# Altium footprint library DM1097_PcbLib.PcbLib: 7 footprints
Each footprint in its own frame and in the unit in brackets; x right, y up, seen from the top. Pads: shape width x height; smd on the part's side, far side on the other; paste and mask are expansions set on the pad; w line width, h text height; cw(c..) or ccw(c..) is an arc to the next point about the centre after c.
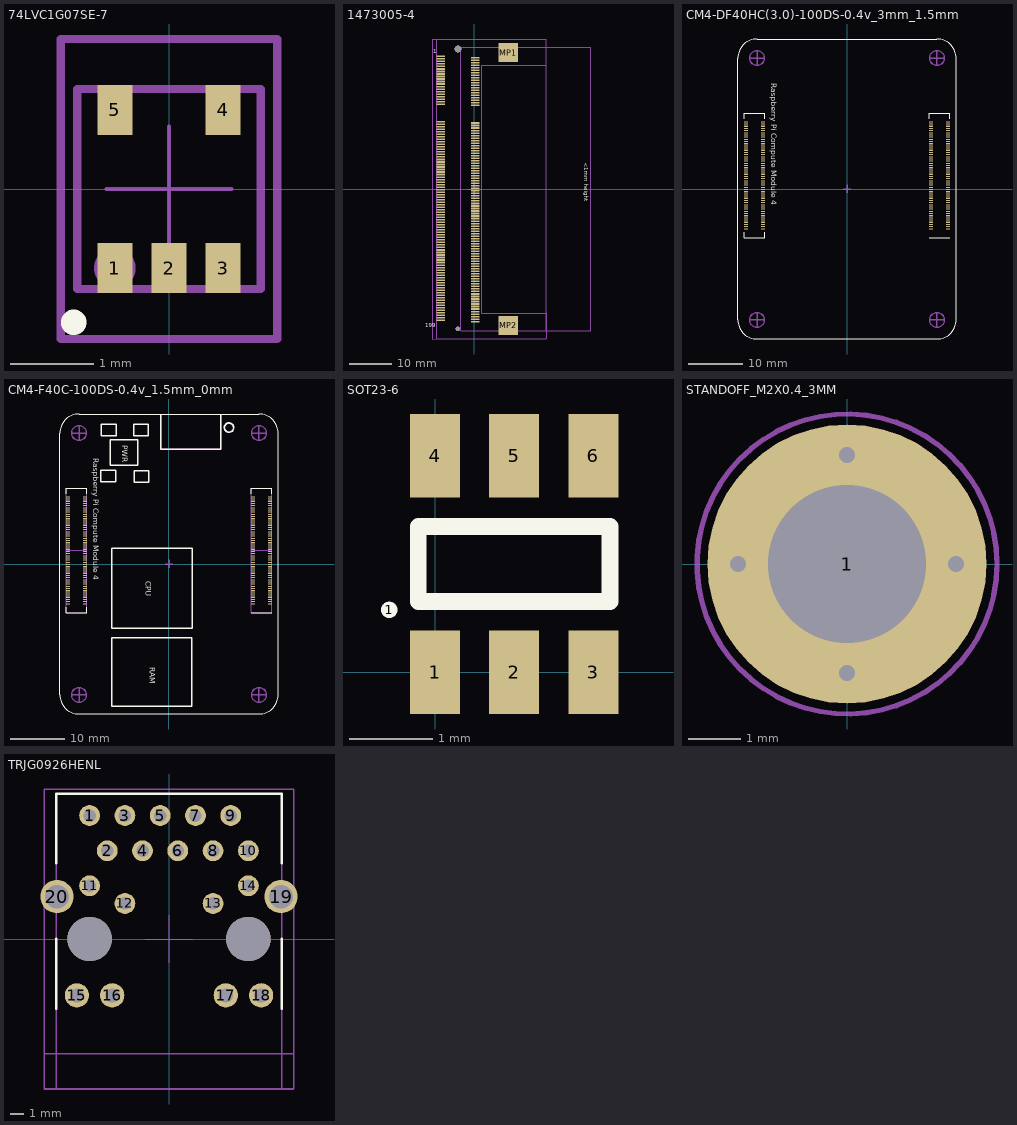
[diagram p0: the footprints below, top view; thin cyan lines are the x and y axes]

## 74LVC1G07SE-7 [mm] "SC70-5 1.1mm"
height 1.1
pads (5):
  rect 0.42x0.6 smd paste-0.025 mask+0.05: 1(-0.65,-0.95) 2(0,-0.95) 3(0.65,-0.95) 4(0.65,0.95) 5(-0.65,0.95)
Top Overlay:
  circle w0.254: c-1.143,-1.6 r0.025
Top Assembly:
  circle w0.1: c-0.65,-0.95 r0.2
  lines w0.1: -1.3,-1.8 -1.3,1.8 1.3,1.8 1.3,-1.8 -1.3,-1.8
  text "'.Designator'" at 0,0 h1
Top Courtyard:
  lines w0.05: -0.75,0 0,0 ; 0,-0.75 0,0 ; 0,0.75 0,0 ; 0.75,0 0,0 ; -1.3,-1.8 1.3,-1.8 1.3,1.8 -1.3,1.8 -1.3,-1.8
Top Component Outline:
  lines w0.1: -1.1,-1.2 1.1,-1.2 1.1,1.2 -1.1,1.2 -1.1,-1.2
3D body "User Library-SOT353-1.step": height 1.1, standoff 0, extent -1.1,-1.2 1.1,1.2

## 1473005-4 [mm] "DDR2 SODIMM SOCKET 200P 5"
height 5.2
pads (204):
  rect 2.05x0.38 smd: 1(-8.05,31.65) 1(-8.05,31.65) 2(0.15,31.35) 2(0.15,31.35) 3(-8.05,31.05) 4(0.15,30.75) 5(-8.05,30.45) 6(0.15,30.15) 7(-8.05,29.85) 8(0.15,29.55) 9(-8.05,29.25) 10(0.15,28.95) 11(-8.05,28.65) 12(0.15,28.35) 13(-8.05,28.05) 14(0.15,27.75) 15(-8.05,27.45) 16(0.15,27.15) 17(-8.05,26.85) 18(0.15,26.55) 19(-8.05,26.25) 20(0.15,25.95) 21(-8.05,25.65) 22(0.15,25.35) 23(-8.05,25.05) 24(0.15,24.75) 25(-8.05,24.45) 26(0.15,24.15) 27(-8.05,23.85) 28(0.15,23.55) 29(-8.05,23.25) 30(0.15,22.95) 31(-8.05,22.65) 32(0.15,22.35) 33(-8.05,22.05) 34(0.15,21.75) 35(-8.05,21.45) 36(0.15,21.15) 37(-8.05,20.85) 38(0.15,20.55) 39(-8.05,20.25) 40(0.15,19.95) 41(-8.05,16.05) 42(0.15,15.75) 43(-8.05,15.45) 44(0.15,15.15) 45(-8.05,14.85) 46(0.15,14.55) 47(-8.05,14.25) 48(0.15,13.95) 49(-8.05,13.65) 50(0.15,13.35) 51(-8.05,13.05) 52(0.15,12.75) 53(-8.05,12.45) 54(0.15,12.15) 55(-8.05,11.85) 56(0.15,11.55) 57(-8.05,11.25) 58(0.15,10.95) 59(-8.05,10.65) 60(0.15,10.35) 61(-8.05,10.05) 62(0.15,9.75) 63(-8.05,9.45) 64(0.15,9.15) 65(-8.05,8.85) 66(0.15,8.55) 67(-8.05,8.25) 68(0.15,7.95) 69(-8.05,7.65) 70(0.15,7.35) 71(-8.05,7.05) 72(0.15,6.75) 73(-8.05,6.45) 74(0.15,6.15) 75(-8.05,5.85) 76(0.15,5.55) 77(-8.05,5.25) 78(0.15,4.95) 79(-8.05,4.65) 80(0.15,4.35) 81(-8.05,4.05) 82(0.15,3.75) 83(-8.05,3.45) 84(0.15,3.15) 85(-8.05,2.85) 86(0.15,2.55) 87(-8.05,2.25) 88(0.15,1.95) 89(-8.05,1.65) 90(0.15,1.35) 91(-8.05,1.05) 92(0.15,0.75) 93(-8.05,0.45) 94(0.15,0.15) 95(-8.05,-0.15) 96(0.15,-0.45) 97(-8.05,-0.75) 98(0.15,-1.05) 99(-8.05,-1.35) 100(0.15,-1.65) 101(-8.05,-1.95) 102(0.15,-2.25) 103(-8.05,-2.55) 104(0.15,-2.85) 105(-8.05,-3.15) 106(0.15,-3.45) 107(-8.05,-3.75) 108(0.15,-4.05) 109(-8.05,-4.35) 110(0.15,-4.65) 111(-8.05,-4.95) 112(0.15,-5.25) 113(-8.05,-5.55) 114(0.15,-5.85) 115(-8.05,-6.15) 116(0.15,-6.45) 117(-8.05,-6.75) 118(0.15,-7.05) 119(-8.05,-7.35) 120(0.15,-7.65) 121(-8.05,-7.95) 122(0.15,-8.25) 123(-8.05,-8.55) 124(0.15,-8.85) 125(-8.05,-9.15) 126(0.15,-9.45) 127(-8.05,-9.75) 128(0.15,-10.05) 129(-8.05,-10.35) 130(0.15,-10.65) 131(-8.05,-10.95) 132(0.15,-11.25) 133(-8.05,-11.55) 134(0.15,-11.85) 135(-8.05,-12.15) 136(0.15,-12.45) 137(-8.05,-12.75) 138(0.15,-13.05) 139(-8.05,-13.35) 140(0.15,-13.65) 141(-8.05,-13.95) 142(0.15,-14.25) 143(-8.05,-14.55) 144(0.15,-14.85) 145(-8.05,-15.15) 146(0.15,-15.45) 147(-8.05,-15.75) 148(0.15,-16.05) 149(-8.05,-16.35) 150(0.15,-16.65) 151(-8.05,-16.95) 152(0.15,-17.25) 153(-8.05,-17.55) 154(0.15,-17.85) 155(-8.05,-18.15) 156(0.15,-18.45) 157(-8.05,-18.75) 158(0.15,-19.05) 159(-8.05,-19.35) 160(0.15,-19.65) 161(-8.05,-19.95) 162(0.15,-20.25) 163(-8.05,-20.55) 164(0.15,-20.85) 165(-8.05,-21.15) 166(0.15,-21.45) 167(-8.05,-21.75) 168(0.15,-22.05) 169(-8.05,-22.35) 170(0.15,-22.65) 171(-8.05,-22.95) 172(0.15,-23.25) 173(-8.05,-23.55) 174(0.15,-23.85) 175(-8.05,-24.15) 176(0.15,-24.45) 177(-8.05,-24.75) 178(0.15,-25.05) 179(-8.05,-25.35) 180(0.15,-25.65) 181(-8.05,-25.95) 182(0.15,-26.25) 183(-8.05,-26.55) 184(0.15,-26.85) 185(-8.05,-27.15) 186(0.15,-27.45) 187(-8.05,-27.75) 188(0.15,-28.05) 189(-8.05,-28.35) 190(0.15,-28.65) 191(-8.05,-28.95) 192(0.15,-29.25) 193(-8.05,-29.55) 194(0.15,-29.85) 195(-8.05,-30.15) 196(0.15,-30.45) 197(-8.05,-30.75) 198(0.15,-31.05) 199(-8.05,-31.35) 200(0.15,-31.65)
  rect 4.6x4.5 smd: MP1(8.05,32.55) MP2(8.05,-32.55)
via -3.95,-33.4 diameter 1.1 hole 1.1
via -3.95,33.4 diameter 1.6 hole 1.6
Top Overlay:
  text "199" at -11.75,-33 h1
  text "1" at -9.85,32.4 h1
  text "<1mm height" at 26.15,6.3 h1
Top Assembly:
  lines w0.1: -9.95,35.8 -9.95,-35.8 17.1,-35.75 17.1,-33.8 ; -9.95,35.801 17.1,35.75 ; -8.95,35.75 17.1,35.75 ; 1.75,29.55 1.75,-29.6 17.1,-29.6 ; 1.75,29.55 1.75,29.55 ; 1.75,29.55 17.1,29.55 17.1,33.8 17.1,33.8 ; 17.1,-29.6 17.1,-29.6 17.1,-33.8 ; 17.1,-29.6 17.1,-29.6 ; 17.1,-33.8 27.75,-33.8 27.75,33.8 17.1,33.8 ; 17.1,33.8 17.1,35.75
  text "'.Designator'" at -0.032,-0.04 h1.52
Board:
  region: -1.75,33.4
Top Courtyard:
  lines w0.1: 0,-1.5 0,0 ; 0,1.6 0,0 ; 1.5,0 0,0 ; 17.1,-33.8 27.75,-33.8 27.75,33.8 17.1,33.8 ; 0,0 -1.6,0 0,0 ; -9.95,-35.801 17.1,-35.75 17.1,-29.6 1.75,-29.6 1.75,29.55 17.1,29.55 17.1,35.75 -9.95,35.801 -9.95,-35.801
  text "<1mm height" at 15.2,4.9 h1
Top Component Outline:
  lines w0.1: 17.1,-33.8 27.75,-33.8 27.75,33.8 17.1,33.8 ; 17.1,-33.8 17.1,33.8 ; 17.1,-33.8 -3.25,-33.8 -3.25,33.8 17.1,33.8 ; 17.1,-33.8 17.1,-35.75 -8.95,-35.75 -8.95,35.75 17.1,35.75 17.1,33.8
3D body "c-1473005-4-j1-3d.stp": height 5.2, standoff -0.7, extent -8.95,-35.75 17.1,35.75
3D body "Compute Module.stp": height 4.8, standoff 2.2, extent -3.25,-33.8 27.75,33.8

## CM4-DF40HC(3.0)-100DS-0.4v_3mm_1.5mm [mm] "DF40HC(3.0)-100DS-0.4v by Amornthep Phunsin"
pads (200):
  rect 0.7x0.2 smd: 1(18.5,-7.3) 2(15.42,-7.3) 3(18.5,-6.9) 4(15.42,-6.9) 5(18.5,-6.5) 6(15.42,-6.5) 7(18.5,-6.1) 8(15.42,-6.1) 9(18.5,-5.7) 10(15.42,-5.7) 11(18.5,-5.3) 12(15.42,-5.3) 13(18.5,-4.9) 14(15.42,-4.9) 15(18.5,-4.5) 16(15.42,-4.5) 17(18.5,-4.1) 18(15.42,-4.1) 19(18.5,-3.7) 20(15.42,-3.7) 21(18.5,-3.3) 22(15.42,-3.3) 23(18.5,-2.9) 24(15.42,-2.9) 25(18.5,-2.5) 26(15.42,-2.5) 27(18.5,-2.1) 28(15.42,-2.1) 29(18.5,-1.7) 30(15.42,-1.7) 31(18.5,-1.3) 32(15.42,-1.3) 33(18.5,-0.9) 34(15.42,-0.9) 35(18.5,-0.5) 36(15.42,-0.5) 37(18.5,-0.1) 38(15.42,-0.1) 39(18.5,0.3) 40(15.42,0.3) 41(18.5,0.7) 42(15.42,0.7) 43(18.5,1.1) 44(15.42,1.1) 45(18.5,1.5) 46(15.42,1.5) 47(18.5,1.9) 48(15.42,1.9) 49(18.5,2.3) 50(15.42,2.3) 51(18.5,2.7) 52(15.42,2.7) 53(18.5,3.1) 54(15.42,3.1) 55(18.5,3.5) 56(15.42,3.5) 57(18.5,3.9) 58(15.42,3.9) 59(18.5,4.3) 60(15.42,4.3) 61(18.5,4.7) 62(15.42,4.7) 63(18.5,5.1) 64(15.42,5.1) 65(18.5,5.5) 66(15.42,5.5) 67(18.5,5.9) 68(15.42,5.9) 69(18.5,6.3) 70(15.42,6.3) 71(18.5,6.7) 72(15.42,6.7) 73(18.5,7.1) 74(15.42,7.1) 75(18.5,7.5) 76(15.42,7.5) 77(18.5,7.9) 78(15.42,7.9) 79(18.5,8.3) 80(15.42,8.3) 81(18.5,8.7) 82(15.42,8.7) 83(18.5,9.1) 84(15.42,9.1) 85(18.5,9.5) 86(15.42,9.5) 87(18.5,9.9) 88(15.42,9.9) 89(18.5,10.3) 90(15.42,10.3) 91(18.5,10.7) 92(15.42,10.7) 93(18.5,11.1) 94(15.42,11.1) 95(18.5,11.5) 96(15.42,11.5) 97(18.5,11.9) 98(15.42,11.9) 99(18.5,12.3) 100(15.42,12.3) 101(-15.42,-7.3) 102(-18.5,-7.3) 103(-15.42,-6.9) 104(-18.5,-6.9) 105(-15.42,-6.5) 106(-18.5,-6.5) 107(-15.42,-6.1) 108(-18.5,-6.1) 109(-15.42,-5.7) 110(-18.5,-5.7) 111(-15.42,-5.3) 112(-18.5,-5.3) 113(-15.42,-4.9) 114(-18.5,-4.9) 115(-15.42,-4.5) 116(-18.5,-4.5) 117(-15.42,-4.1) 118(-18.5,-4.1) 119(-15.42,-3.7) 120(-18.5,-3.7) 121(-15.42,-3.3) 122(-18.5,-3.3) 123(-15.42,-2.9) 124(-18.5,-2.9) 125(-15.42,-2.5) 126(-18.5,-2.5) 127(-15.42,-2.1) 128(-18.5,-2.1) 129(-15.42,-1.7) 130(-18.5,-1.7) 131(-15.42,-1.3) 132(-18.5,-1.3) 133(-15.42,-0.9) 134(-18.5,-0.9) 135(-15.42,-0.5) 136(-18.5,-0.5) 137(-15.42,-0.1) 138(-18.5,-0.1) 139(-15.42,0.3) 140(-18.5,0.3) 141(-15.42,0.7) 142(-18.5,0.7) 143(-15.42,1.1) 144(-18.5,1.1) 145(-15.42,1.5) 146(-18.5,1.5) 147(-15.42,1.9) 148(-18.5,1.9) 149(-15.42,2.3) 150(-18.5,2.3) 151(-15.42,2.7) 152(-18.5,2.7) 153(-15.42,3.1) 154(-18.5,3.1) 155(-15.42,3.5) 156(-18.5,3.5) 157(-15.42,3.9) 158(-18.5,3.9) 159(-15.42,4.3) 160(-18.5,4.3) 161(-15.42,4.7) 162(-18.5,4.7) 163(-15.42,5.1) 164(-18.5,5.1) 165(-15.42,5.5) 166(-18.5,5.5) 167(-15.42,5.9) 168(-18.5,5.9) 169(-15.42,6.3) 170(-18.5,6.3) 171(-15.42,6.7) 172(-18.5,6.7) 173(-15.42,7.1) 174(-18.5,7.1) 175(-15.42,7.5) 176(-18.5,7.5) 177(-15.42,7.9) 178(-18.5,7.9) 179(-15.42,8.3) 180(-18.5,8.3) 181(-15.42,8.7) 182(-18.5,8.7) 183(-15.42,9.1) 184(-18.5,9.1) 185(-15.42,9.5) 186(-18.5,9.5) 187(-15.42,9.9) 188(-18.5,9.9) 189(-15.42,10.3) 190(-18.5,10.3) 191(-15.42,10.7) 192(-18.5,10.7) 193(-15.42,11.1) 194(-18.5,11.1) 195(-15.42,11.5) 196(-18.5,11.5) 197(-15.42,11.9) 198(-18.5,11.9) 199(-15.42,12.3) 200(-18.5,12.3)
Top Overlay:
  lines w0.12: -18.85,-7.9 -18.85,-8.9 -15.07,-8.9 -15.07,-7.9 ; -18.85,12.9 -18.85,13.9 -15.07,13.9 -15.07,12.9 ; 15.07,-8.9 18.85,-8.9 ; 15.07,12.9 15.07,13.9 18.85,13.9 18.85,12.9 ; -20,-24 ccw(c-16.5,-24) -16.5,-27.5 16.5,-27.5 ccw(c16.5,-24) 20,-24 20,24 ccw(c16.5,24) 16.5,27.5 -16.5,27.5 ccw(c-16.5,24) -20,24 -20,-24
  text "Raspberry Pi Compute Module 4" at -13.913,19.346 h1
Top Component Outline:
  circle w0.254: c-16.5,24 r1.35
  circle w0.254: c16.5,24 r1.35
  circle w0.254: c16.5,-24 r1.35
  circle w0.254: c-16.5,-24 r1.35
  lines w0.254: -17.85,-24 -15.15,-24 ; -17.85,24 -15.15,24 ; -16.5,-25.35 -16.5,-22.65 ; -16.5,22.65 -16.5,25.35 ; -0.7,0 0.7,0 ; 0,-0.7 0,0.8 ; 15.15,-24 17.85,-24 ; 15.15,24 17.85,24 ; 16.5,-25.35 16.5,-22.65 ; 16.5,22.65 16.5,25.35
3D body "CM4.step": height 6.65, standoff 1.87, extent -20,-27.5 20,27.5
3D body "DF40HC(3.0)-100DS-0.4V.stp": height 2.9, standoff 0, extent -18.69,-8.785 -15.31,13.815
3D body "DF40HC(3.0)-100DS-0.4V.stp": height 2.9, standoff 0, extent 15.31,-8.785 18.69,13.815

## CM4-F40C-100DS-0.4v_1.5mm_0mm [mm] "DF40C-100DS-0.4v by Amornthep Phunsin"
pads (200):
  rect 0.7x0.2 smd: 1(18.5,-7.3) 2(15.42,-7.3) 3(18.5,-6.9) 4(15.42,-6.9) 5(18.5,-6.5) 6(15.42,-6.5) 7(18.5,-6.1) 8(15.42,-6.1) 9(18.5,-5.7) 10(15.42,-5.7) 11(18.5,-5.3) 12(15.42,-5.3) 13(18.5,-4.9) 14(15.42,-4.9) 15(18.5,-4.5) 16(15.42,-4.5) 17(18.5,-4.1) 18(15.42,-4.1) 19(18.5,-3.7) 20(15.42,-3.7) 21(18.5,-3.3) 22(15.42,-3.3) 23(18.5,-2.9) 24(15.42,-2.9) 25(18.5,-2.5) 26(15.42,-2.5) 27(18.5,-2.1) 28(15.42,-2.1) 29(18.5,-1.7) 30(15.42,-1.7) 31(18.5,-1.3) 32(15.42,-1.3) 33(18.5,-0.9) 34(15.42,-0.9) 35(18.5,-0.5) 36(15.42,-0.5) 37(18.5,-0.1) 38(15.42,-0.1) 39(18.5,0.3) 40(15.42,0.3) 41(18.5,0.7) 42(15.42,0.7) 43(18.5,1.1) 44(15.42,1.1) 45(18.5,1.5) 46(15.42,1.5) 47(18.5,1.9) 48(15.42,1.9) 49(18.5,2.3) 50(15.42,2.3) 51(18.5,2.7) 52(15.42,2.7) 53(18.5,3.1) 54(15.42,3.1) 55(18.5,3.5) 56(15.42,3.5) 57(18.5,3.9) 58(15.42,3.9) 59(18.5,4.3) 60(15.42,4.3) 61(18.5,4.7) 62(15.42,4.7) 63(18.5,5.1) 64(15.42,5.1) 65(18.5,5.5) 66(15.42,5.5) 67(18.5,5.9) 68(15.42,5.9) 69(18.5,6.3) 70(15.42,6.3) 71(18.5,6.7) 72(15.42,6.7) 73(18.5,7.1) 74(15.42,7.1) 75(18.5,7.5) 76(15.42,7.5) 77(18.5,7.9) 78(15.42,7.9) 79(18.5,8.3) 80(15.42,8.3) 81(18.5,8.7) 82(15.42,8.7) 83(18.5,9.1) 84(15.42,9.1) 85(18.5,9.5) 86(15.42,9.5) 87(18.5,9.9) 88(15.42,9.9) 89(18.5,10.3) 90(15.42,10.3) 91(18.5,10.7) 92(15.42,10.7) 93(18.5,11.1) 94(15.42,11.1) 95(18.5,11.5) 96(15.42,11.5) 97(18.5,11.9) 98(15.42,11.9) 99(18.5,12.3) 100(15.42,12.3) 101(-15.42,-7.3) 102(-18.5,-7.3) 103(-15.42,-6.9) 104(-18.5,-6.9) 105(-15.42,-6.5) 106(-18.5,-6.5) 107(-15.42,-6.1) 108(-18.5,-6.1) 109(-15.42,-5.7) 110(-18.5,-5.7) 111(-15.42,-5.3) 112(-18.5,-5.3) 113(-15.42,-4.9) 114(-18.5,-4.9) 115(-15.42,-4.5) 116(-18.5,-4.5) 117(-15.42,-4.1) 118(-18.5,-4.1) 119(-15.42,-3.7) 120(-18.5,-3.7) 121(-15.42,-3.3) 122(-18.5,-3.3) 123(-15.42,-2.9) 124(-18.5,-2.9) 125(-15.42,-2.5) 126(-18.5,-2.5) 127(-15.42,-2.1) 128(-18.5,-2.1) 129(-15.42,-1.7) 130(-18.5,-1.7) 131(-15.42,-1.3) 132(-18.5,-1.3) 133(-15.42,-0.9) 134(-18.5,-0.9) 135(-15.42,-0.5) 136(-18.5,-0.5) 137(-15.42,-0.1) 138(-18.5,-0.1) 139(-15.42,0.3) 140(-18.5,0.3) 141(-15.42,0.7) 142(-18.5,0.7) 143(-15.42,1.1) 144(-18.5,1.1) 145(-15.42,1.5) 146(-18.5,1.5) 147(-15.42,1.9) 148(-18.5,1.9) 149(-15.42,2.3) 150(-18.5,2.3) 151(-15.42,2.7) 152(-18.5,2.7) 153(-15.42,3.1) 154(-18.5,3.1) 155(-15.42,3.5) 156(-18.5,3.5) 157(-15.42,3.9) 158(-18.5,3.9) 159(-15.42,4.3) 160(-18.5,4.3) 161(-15.42,4.7) 162(-18.5,4.7) 163(-15.42,5.1) 164(-18.5,5.1) 165(-15.42,5.5) 166(-18.5,5.5) 167(-15.42,5.9) 168(-18.5,5.9) 169(-15.42,6.3) 170(-18.5,6.3) 171(-15.42,6.7) 172(-18.5,6.7) 173(-15.42,7.1) 174(-18.5,7.1) 175(-15.42,7.5) 176(-18.5,7.5) 177(-15.42,7.9) 178(-18.5,7.9) 179(-15.42,8.3) 180(-18.5,8.3) 181(-15.42,8.7) 182(-18.5,8.7) 183(-15.42,9.1) 184(-18.5,9.1) 185(-15.42,9.5) 186(-18.5,9.5) 187(-15.42,9.9) 188(-18.5,9.9) 189(-15.42,10.3) 190(-18.5,10.3) 191(-15.42,10.7) 192(-18.5,10.7) 193(-15.42,11.1) 194(-18.5,11.1) 195(-15.42,11.5) 196(-18.5,11.5) 197(-15.42,11.9) 198(-18.5,11.9) 199(-15.42,12.3) 200(-18.5,12.3)
Top Overlay:
  circle w0.254: c11,25 r0.86
  lines w0.02: -1.5,24 -1.5,27.5 -1.5,21 9.5,21 9.5,27.5
  lines w0.12: -18.85,-7.9 -18.85,-8.9 -15.07,-8.9 ; -18.85,12.9 -18.85,13.9 -15.07,13.9 ; 15.07,-8.9 18.85,-8.9 ; 18.85,12.9 18.85,13.9 15.07,13.9 ; -15.07,-8.9 -15.07,-7.9 -15.07,-8.9 ; -15.07,13.9 -15.07,12.9 -15.07,13.9 ; 15.07,13.9 15.07,12.9 15.07,13.9 ; -20,-24 ccw(c-16.5,-24) -16.5,-27.5 16.5,-27.5 ccw(c16.5,-24) 20,-24 20,24 ccw(c16.5,24) 16.5,27.5 -16.5,27.5 ccw(c-16.5,24) -20,24 -20,-24
  lines w0.254: -1.5,24 -1.5,27.5 -1.5,21 9.5,21 9.5,27.5 ; -12.5,15.1 -9.8,15.1 -9.8,17.2 -12.5,17.2 -12.5,15.1 ; -12.4,23.5 -9.7,23.5 -9.7,25.6 -12.4,25.6 -12.4,23.5 ; -10.8,18.1 -10.8,22.8 -5.7,22.8 -5.7,18.1 -10.8,18.1 ; -10.5,-26.1 -10.5,-13.5 4.2,-13.5 4.2,-26.1 -10.5,-26.1 ; -10.5,-11.8 -10.5,2.9 4.3,2.9 4.3,-11.8 -10.5,-11.8 ; -6.5,23.5 -3.8,23.5 -3.8,25.6 -6.5,25.6 -6.5,23.5 ; -6.4,15 -3.7,15 -3.7,17.1 -6.4,17.1 -6.4,15
  text "PWR" at -8.602,21.761 h1
  text "RAM" at -3.546,-18.954 h1
  text "CPU" at -4.246,-3.154 h1
  text "Raspberry Pi Compute Module 4" at -13.913,19.346 h1
Board:
  circle w0.254: c16.5,24 r1.35
  circle w0.254: c16.5,-24 r1.35
  circle w0.254: c-16.5,24 r1.35
  circle w0.254: c-16.5,-24 r1.35
  circle w0.254: c11,25 r0.806
  lines w0.12: -18.83,2.5 -15.05,2.5 ; 15.07,2.5 18.85,2.5 ; -18.85,-8.9 -15.07,-8.9 -15.07,13.9 -18.85,13.9 -18.85,-8.9 ; 15.07,-8.9 15.07,13.9 18.85,13.9 18.85,-8.9 15.07,-8.9
  lines w0.254: -17.85,-24 -15.15,-24 ; -17.85,24 -15.15,24 ; -16.5,-25.35 -16.5,-22.65 ; -16.5,22.65 -16.5,25.35 ; -1.5,27.5 -1.5,21 9.5,21 9.5,27.5 ; -0.7,0 0.7,0 ; 0,-0.7 0,0.8 ; 15.15,-24 17.85,-24 ; 15.15,24 17.85,24 ; 16.5,-25.35 16.5,-22.65 ; 16.5,22.65 16.5,25.35
  text "Wireless / Cutout" at -0.932,23.1 h0.9
  text "PCIe" at -18,-3.051 h0.7
  text "USB" at -16.9,-4.134 h0.7
  text "CAM1" at -16.9,0.749 h0.7
  text "HDMI1" at -18.1,5.958 h0.7
  text "ETH" at 16.5,-4.751 h0.7
  text "TV" at -17,-2.751 h0.7
  text "HDMI0" at -18,10.374 h0.7
  text "CAM0" at -18,0.783 h0.7
  text "5V" at 17,9.9 h0.7
  text "DSI0" at -16.9,6.949 h0.7
  text "DS1" at -17.5,13.049 h0.7
  text "1V8" at 15.8,11.225 h0.7
  text "3V3" at 15.8,8.625 h0.7
  text "SD" at 16.4,6.991 h0.7
  text "GPIO" at 16.5,0.625 h0.7
3D body "cm4-rev1-3_new.STEP": height 5.15, standoff 0.37, extent -20,-27.5 20,27.5
3D body "DF40C-100DS.stp": height 1.4, standoff -0.05, extent 15.31,-8.785 18.69,13.815
3D body "DF40C-100DS.stp": height 1.4, standoff -0.05, extent -18.69,-8.785 -15.31,13.815

## SOT23-6 [mm]
pads (7):
  round 0.2 on Top Overlay: 1(-0.55,0.75)
  rect 0.6x1 smd: 1(0,0) 2(0.95,0) 3(1.9,0) 4(0,2.6) 5(0.95,2.6) 6(1.9,2.6)
Top Overlay:
  lines w0.2: -0.2,0.85 -0.2,1.75 2.1,1.75 2.1,0.85 -0.2,0.85
3D body "SOT236.step": height 1, standoff 0, extent -0.51,0.13 2.41,2.47

## STANDOFF_M2X0.4_3MM [mm] "SMD standoff, such as 9774030243R by Wurth"
height 3
pads (1):
  round 5.3 / inner round 2.7 / far side round 2.7 hole 3 unplated mask+0.05: 1(0,0)
via 0,2.075 diameter 0.61 hole 0.305
via 0,-2.075 diameter 0.61 hole 0.305
via -2.075,0 diameter 0.61 hole 0.305
via 2.075,0 diameter 0.61 hole 0.305
Top Paste:
  region: 0.317,2.581 0.278,1.576 0.397,1.55 0.628,1.471 0.845,1.359 1.042,1.214 1.214,1.042 1.359,0.845 1.471,0.628 1.55,0.397 1.576,0.278 2.581,0.317 2.554,0.531 2.432,0.946 2.242,1.334 1.991,1.686 1.686,1.991 1.334,2.242 0.946,2.432 0.531,2.554
  region: 2.581,-0.317 1.576,-0.278 1.55,-0.397 1.471,-0.628 1.359,-0.845 1.214,-1.042 1.042,-1.214 0.845,-1.359 0.628,-1.471 0.397,-1.55 0.278,-1.576 0.317,-2.581 0.531,-2.554 0.946,-2.432 1.334,-2.242 1.686,-1.991 1.991,-1.686 2.242,-1.334 2.432,-0.946 2.554,-0.531
  region: -0.317,-2.581 -0.278,-1.576 -0.397,-1.55 -0.628,-1.471 -0.845,-1.359 -1.042,-1.214 -1.214,-1.042 -1.359,-0.845 -1.471,-0.628 -1.55,-0.397 -1.576,-0.278 -2.581,-0.317 -2.554,-0.531 -2.432,-0.946 -2.242,-1.334 -1.991,-1.686 -1.686,-1.991 -1.334,-2.242 -0.946,-2.432 -0.531,-2.554
  region: -2.581,0.317 -1.576,0.278 -1.55,0.397 -1.471,0.628 -1.359,0.845 -1.214,1.042 -1.042,1.214 -0.845,1.359 -0.628,1.471 -0.397,1.55 -0.278,1.576 -0.317,2.581 -0.531,2.554 -0.946,2.432 -1.334,2.242 -1.686,1.991 -1.991,1.686 -2.242,1.334 -2.432,0.946 -2.554,0.531
Top Assembly:
  circle w0.1: c0,0 r2.85
  text "'.Designator'" at -2,-0.5 h1
Top Courtyard:
  circle w0.1: c0,0 r2.85
  lines w0.1: -0.5,0 0.5,0 ; 0,-0.5 0,0.5
Bottom Courtyard:
  circle w0.1: c0,0 r2.85
Top Component Outline:
  circle w0.1: c0,0 r2.175
3D body "9774030243R (rev1).stp": height 3.05, standoff -1.35, extent -2.175,-2.172 2.175,2.172

## TRJG0926HENL [mm] "TRXCOM TRJG0926HENL 1000BASE-T PoE"
height 13.3
pads (22):
  round 1.5 hole 0.9: 1(-5.715,8.89) 2(-4.445,6.35) 3(-3.175,8.89) 4(-1.905,6.35) 5(-0.635,8.89) 6(0.635,6.35) 7(1.905,8.89) 8(3.175,6.35) 9(4.445,8.89) 10(5.715,6.35) 11(-5.715,3.83) 12(-3.175,2.56) 13(3.175,2.56) 14(5.715,3.83)
  round 1.75 hole 1.02: 15(-6.63,-4.06) 16(-4.09,-4.06) 17(4.09,-4.06) 18(6.63,-4.06)
  round 2.4 hole 1.7: 19(8.064,3.05) 20(-8.064,3.05)
  round 3.2 hole 3.2: ""(-5.715,0) ""(5.715,0)
Top Overlay:
  lines w0.2: -8.115,-5 -8.115,0 ; -8.115,5.45 -8.115,10.45 8.115,10.45 8.115,5.45 ; 8.115,-5 8.115,0
Top Assembly:
  lines w0.1: -9,-8.26 9,-8.26 ; -9,-10.8 9,-10.8 9,10.8 -9,10.8 -9,-10.8
  text "'.Designator'" at 0,0 h1
Top Courtyard:
  lines w0.05: -1.7,0 0,0 ; 0,-1.7 0,0 ; 0,1.7 0,0 ; 1.7,0 0,0 ; -9,-10.8 -9,10.8 9,10.8 9,-10.8 -9,-10.8
Top Component Outline:
  lines w0.1: -8.115,-10.8 -8.115,10.45 8.115,10.45 8.115,-10.8 -8.115,-10.8
3D body "TRJG0926HENL.stp": height 13.65, standoff -3.65, extent -8.115,-10.8 8.115,10.45